# Altium schematic symbol library SCHLIB.SchLib: 2608 symbols (part 4 of 20)
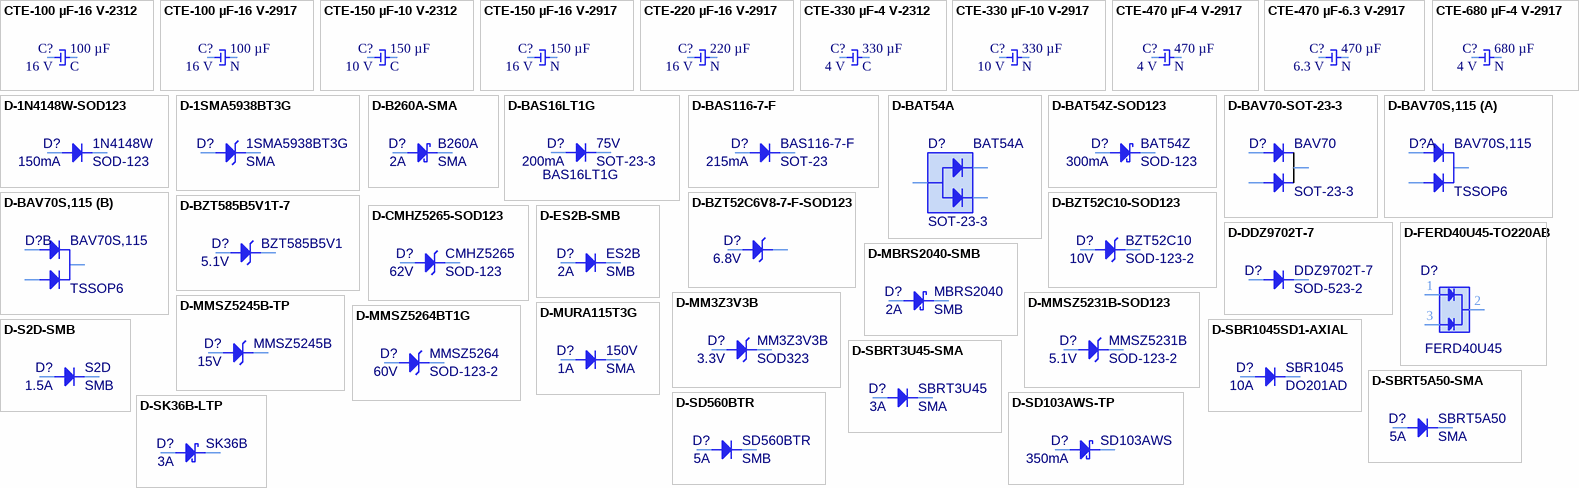
[diagram p86: symbols CTE-100 µF-16 V-2312 to D-SK36B-LTP]

## D-MMSZ5264BT1G
designator D?, comment MMSZ5264  Case/Package: SOD-123-2  Zener Voltage: 60V
DIODE ZENER 60V 500MW SOD123; Manufacturer: ON Semiconductor; Manufacturer Part Number: MMSZ5264BT1G; Material: Plastic; Tolerance: 5%; Impedance: 170R; Forward Voltage: 900mV; Max Reverse Leakage Current: 100nA; Test Current: 2.1mA; Element Configuration: Single; ESD Protection: Yes; Zener Current: 10mA; Supplier 1: Digi-Key; Supplier Part Number 1: MMSZ5264BT1GOSCT-ND; Stock: 12288; Pricing: 1=0.2, 10=0.162, 25=0.136, 100=0.0664, 250=0.0654, 500=0.0554, 1000=0.0385 (USD); RoHS: Yes; Number of Pins: 2; Contact Plating: Tin,Matte; Min Operating Temperature: -55°C; Max Operating Temperature: 150°C; Packaging: Tape and Reel; Max Power Dissipation: 500mW; Power Rating: 500mW; Package Quantity: 1; Voltage Tolerance: 5%; Power Dissipation: 500mW; Working Voltage: 60V; Peak Reverse Current: 100nA; Length: 2.84mm; Height: 1.25mm; Width: 1.8mm; Radiation Hardening: No; Lead Free: Lead Free; ComponentLink1URL: https://datasheet.ciiva.com/30478/0900766b81276af2-30478667.pdf?src-supplier=RSComponents; ComponentLink1Description: https://datasheet.ciiva.com/30478/0900766b81276af2-30478667.pdf?src-supplier=RSComponents; ComponentLink2URL: https://datasheet.ciiva.com/894/mmsz5221bt1-d-894960.pdf?src-supplier=Digi-Key; ComponentLink2Description: https://datasheet.ciiva.com/894/mmsz5221bt1-d-894960.pdf?src-supplier=Digi-Key; ComponentLink3URL: https://datasheet.ciiva.com/894/mmsz5221bt1-d-894961.pdf?src-supplier=Digi-Key; ComponentLink3Description: https://datasheet.ciiva.com/894/mmsz5221bt1-d-894961.pdf?src-supplier=Digi-Key; ComponentLink4URL: https://datasheet.ciiva.com/8348/mmsz5221bt1-d-8348069.pdf?src-supplier=Avnet; ComponentLink4Description: https://datasheet.ciiva.com/8348/mmsz5221bt1-d-8348069.pdf?src-supplier=Avnet; ComponentLink5URL: https://datasheet.ciiva.com/4733/mmsz5221bt1-d-4733559.pdf?src-supplier=Mouser; ComponentLink5Description: https://datasheet.ciiva.com/4733/mmsz5221bt1-d-4733559.pdf?src-supplier=Mouser; ComponentLink6URL: https://datasheet.ciiva.com/16375/mmsz5221bt1-d-16375896.pdf?src-supplier=Future+Electronics; ComponentLink6Description: https://datasheet.ciiva.com/16375/mmsz5221bt1-d-16375896.pdf?src-supplier=Future+Electronics; ComponentLink7URL: https://datasheet.ciiva.com/894/mmsz5221bt1-d-894959.pdf?src-supplier=Digi-Key; ComponentLink7Description: https://datasheet.ciiva.com/894/mmsz5221bt1-d-894959.pdf?src-supplier=Digi-Key; Voltage Rating (DC): 60V
footprint D-SOD-123-2 (SOD, 2-Leads, Body 2.69x1.6mm)
pins: A, C

## D-MURA115T3G
designator D?, comment Max Reverse Voltage (DC): 150V  Current Rating: 1A  Case/Package: SMA  (hidden comment: MURA115T3G)
DIODE GEN PURP 150V 2A SMA; Manufacturer: ON Semiconductor; Max Surge Current: 40A; Forward Voltage: 875mV; Peak Reverse Current: 2uA; Recovery Time: 35ns; Element Configuration: Single; Polarity: Standard; Washability: OK; Supplier 1: Digi-Key; Manufacturer Part Number: MURA115T3G; Stock 1: 18980; Pricing 1: 1=0.41000, 10=0.32800, 100=0.18850, 500=0.17458, 1000=0.11871 (USD); RoHS: Yes; Number of Pins: 2; Contact Plating: Tin,Matte; Min Operating Temperature: -65°C; Max Operating Temperature: 175°C; Package Quantity: 1; Forward Current: 2A; Packaging: Tape and Reel; Reverse Recovery Time: 35ns; Peak Non-Repetitive Surge Current: 40A; Max Repetitive Reverse Voltage (Vrrm): 150V; Max Forward Surge Current (Ifsm): 40A; Voltage Rating (DC): 150V; Output Current: 1A; Reverse Voltage: 150V; Length: 4.57mm; Height: 2.05mm; Width: 2.92mm; Radiation Hardening: No; REACH SVHC: No SVHC; Lead Free: Lead Free; Halogen Free: Halogen Free; ComponentLink1URL: https://datasheet.ciiva.com/923/mura115t3-d-923155.pdf?src-supplier=Digi-Key; ComponentLink1Description: https://datasheet.ciiva.com/923/mura115t3-d-923155.pdf?src-supplier=Digi-Key; ComponentLink2URL: https://datasheet.ciiva.com/923/mura115t3-d-923156.pdf?src-supplier=Digi-Key; ComponentLink2Description: https://datasheet.ciiva.com/923/mura115t3-d-923156.pdf?src-supplier=Digi-Key; ComponentLink3URL: https://datasheet.ciiva.com/25950/mura115t3-d-25950373.pdf?src-supplier=Avnet+Europe; ComponentLink3Description: https://datasheet.ciiva.com/25950/mura115t3-d-25950373.pdf?src-supplier=Avnet+Europe; ComponentLink4URL: https://datasheet.ciiva.com/8292/mura115t3-d-8292665.pdf?src-supplier=Avnet; ComponentLink4Description: https://datasheet.ciiva.com/8292/mura115t3-d-8292665.pdf?src-supplier=Avnet; ComponentLink5URL: https://datasheet.ciiva.com/923/mura115t3-d-923157.pdf?src-supplier=Digi-Key; ComponentLink5Description: https://datasheet.ciiva.com/923/mura115t3-d-923157.pdf?src-supplier=Digi-Key; Supplier Part Number 1: MURA115T3GOSCT-ND; Average Rectified Current: 2A
footprint D-SMA-DO214AC
pins: A, C

## D-S2D-SMB
designator D?, comment S2D  Average Rectified Current: 1.5A  Case/Package: SMB
DIODE GEN PURP 200V 1.5A SMB; Manufacturer: Vishay Semiconductors; Manufacturer Part Number: S2D-E3/5BT; Peak Reverse Current: 1uA; Max Surge Current: 50A; Recovery Time: 2000ns; Forward Voltage: 1.15V; Reverse Recovery Time: 2us; Element Configuration: Single; Washability: OK; Supplier 1: Digi-Key; Supplier Part Number 1: S2D-E3/5BTGICT-ND; Stock 1: 13927; Pricing 1: 1=0.44, 10=0.331, 100=0.1872, 500=0.12396, 1000=0.09503 (USD); Mount: Surface Mount; Number of Pins: 2; Min Operating Temperature: -55°C; Max Operating Temperature: 150°C; Packaging: Tape and Reel; Forward Current: 1.5A; Package Quantity: 1; Max Repetitive Reverse Voltage (Vrrm): 200V; Peak Non-Repetitive Surge Current: 50A; Max Reverse Voltage (DC): 200V; Reverse Voltage: 200V; Radiation Hardening: No; Lead Free: Lead Free
footprint D-SMB-DO214AA
pins: A, C

## D-SBR1045SD1-AXIAL
designator D?, comment SBR1045  Average Rectified Current: 10A  Package / Case: DO201AD
DIODE SBR 45V 10A DO201AD; Manufacturer: Diodes; Manufacturer Part Number: SBR1045SD1-T; Peak Reverse Current: 450uA; Forward Voltage: 550mV; Peak Non-Repetitive Surge Current: 180A; Element Configuration: Single; Washability: OK; Supplier 1: Digi-Key; Supplier Part Number 1: SBR1045SD1-TDICT-ND; Stock 1: 4145; Pricing 1: 1=0.74, 10=0.654, 100=0.5016, 500=0.39656 (USD); Mount: Through Hole; Number of Pins: 2; Min Operating Temperature: -65°C; Max Operating Temperature: 150°C; Forward Current: 10A; Packaging: Tape and Reel; Package Quantity: 1200; Reverse Voltage (DC): 45V; Radiation Hardening: No; REACH SVHC: No SVHC; Lead Free: Lead Free; ComponentLink1URL: https://www.diodes.com/assets/Datasheets/SBR1045SD1.pdf; ComponentLink1Description: https://www.diodes.com/assets/Datasheets/SBR1045SD1.pdf; ComponentLink2URL: http://www.mouser.com/ds/2/115/SBR1045SD1-464814.pdf; ComponentLink2Description: http://www.mouser.com/ds/2/115/SBR1045SD1-464814.pdf; Max Repetitive Reverse Voltage (Vrrm): 45V; Weight: 0.038801oz; Max Reverse Voltage (DC): 45V
footprint D-DO-201-H
pins: A, C

## D-SBRT3U45-SMA
designator D?, comment SBRT3U45  Average Rectified Current: 3A  Case/Package: SMA
DIODE SBR 45V 3A SMA; Manufacturer: Diodes; Manufacturer Part Number: SBRT3U45SA-13; Element Configuration: Single; Forward Voltage: 420mV; Max Forward Surge Current (Ifsm): 50A; Peak Reverse Current: 40mA; Washability: OK; Supplier 1: Digi-Key; Supplier Part Number 1: SBRT3U45SA-13DIDKR-ND; Stock 1: 4929; Pricing 1: 1=0.43, 10=0.346, 100=0.2357, 500=0.17674, 1000=0.13256 (USD); Mount: Surface Mount; Weight: 0.002258oz; Min Operating Temperature: -55°C; Max Operating Temperature: 150°C; Packaging: Tape and Reel; Max Repetitive Reverse Voltage (Vrrm): 45V; Package Quantity: 5000; Max Reverse Voltage (DC): 45V; Lead Free: Lead Free
footprint D-SMA-DO214AC
pins: A, C

## D-SBRT5A50-SMA
designator D?, comment SBRT5A50  Average Rectified Current: 5A  Case/Package: SMA
DIODE SBR 50V 5A SMA; Manufacturer: Diodes; Manufacturer Part Number: SBRT5A50SA-13; Element Configuration: Single; Forward Voltage: 460mV; Max Forward Surge Current (Ifsm): 70A; Peak Reverse Current: 45mA; Washability: OK; Supplier 1: Digi-Key; Supplier Part Number 1: SBRT5A50SA-13DIDKR-ND; Stock 1: 46931; Pricing 1: 1=0.53, 10=0.426, 100=0.29, 500=0.21754, 1000=0.16315 (USD); Mount: Surface Mount; Weight: 0.002258oz; Min Operating Temperature: -55°C; Max Operating Temperature: 150°C; Packaging: Tape and Reel; Max Repetitive Reverse Voltage (Vrrm): 50V; Package Quantity: 5000; Max Reverse Voltage (DC): 50V; Lead Free: Lead Free
footprint D-SMA-DO214AC
pins: A, C

## D-SD103AWS-TP
designator D?, comment SD103AWS  Current Rating: 350mA
DIODE SCHOTTKY 40V 350MA SOD323; Manufacturer: MCC; Manufacturer Part Number: SD103AWS-TP; Forward Voltage: 600mV; Recovery Time: 10ns; Peak Non-Repetitive Surge Current: 1.5A; Peak Reverse Current: 5uA; Element Configuration: Single; Polarity: Standard; Capacitance: 50pF; Power Dissipation: 400mW; Washability: OK; Supplier 1: Digi-Key; Stock 1: 63676; Pricing 1: 1=0.34000, 10=0.27700, 100=0.14680, 500=0.09656, 1000=0.06566 (USD); RoHS: Yes; Mount: Surface Mount; Number of Pins: 2; Min Operating Temperature: -55°C; Max Operating Temperature: 125°C; Packaging: Tape and Reel; Package Quantity: 1; Average Rectified Current: 350mA; Reverse Recovery Time: 10ns; Max Repetitive Reverse Voltage (Vrrm): 40V; Forward Current: 350mA; Max Forward Surge Current (Ifsm): 1.5A; Voltage Rating (DC): 40V; Output Current: 350mA; Max Reverse Voltage (DC): 40V; Max Surge Current: 1.5A; Max Reverse Leakage Current: 5uA; Radiation Hardening: No; Lead Free: Lead Free; REACH SVHC: Unknown; ComponentLink1URL: https://datasheet.ciiva.com/15200/getdatasheetpartid-331926-15200560.pdf?src-supplier=Verical; ComponentLink1Description: https://datasheet.ciiva.com/15200/getdatasheetpartid-331926-15200560.pdf?src-supplier=Verical; ComponentLink2URL: https://datasheet.ciiva.com/16975/sd103aws-sd103cwssod-323-16975366.pdf?src-supplier=Future+Electronics; ComponentLink2Description: https://datasheet.ciiva.com/16975/sd103aws-sd103cwssod-323-16975366.pdf?src-supplier=Future+Electronics; ComponentLink3URL: https://datasheet.ciiva.com/912/sd103aws-sd103cwssod-323-912220.pdf?src-supplier=Digi-Key; ComponentLink3Description: https://datasheet.ciiva.com/912/sd103aws-sd103cwssod-323-912220.pdf?src-supplier=Digi-Key; ComponentLink4URL: https://datasheet.ciiva.com/912/sd103aws-sd103cwssod-323-912221.pdf?src-supplier=Digi-Key; ComponentLink4Description: https://datasheet.ciiva.com/912/sd103aws-sd103cwssod-323-912221.pdf?src-supplier=Digi-Key; ComponentLink5URL: https://datasheet.ciiva.com/7963/1684867-7963309.pdf?src-supplier=Element14; ComponentLink5Description: https://datasheet.ciiva.com/7963/1684867-7963309.pdf?src-supplier=Element14; ComponentLink6URL: https://datasheet.ciiva.com/912/sd103aws-sd103cwssod-323-912222.pdf?src-supplier=Digi-Key; ComponentLink6Description: https://datasheet.ciiva.com/912/sd103aws-sd103cwssod-323-912222.pdf?src-supplier=Digi-Key; Supplier Part Number 1: SD103AWSTPMSCT-ND
footprint D-SOD323
pins: A, C

## D-SD560BTR
designator D?, comment SD560BTR  Average Rectified Current: 5A  Case/Package: SMB
DIODE GEN 600V 5A; Manufacturer: SMC; Supplier 1: Digi-Key; Manufacturer Part Number: SD560BTR; Stock 1: 85170; Pricing 1: 1=0,40000, 10=0,26300, 100=0,14640, 500=0,09760, 1000=0,07133 (USD); RoHS: No; Mount: Surface Mount; Packaging: Tape and Reel; Max Reverse Voltage (DC): 600V; ComponentLink1URL: http://www.smc-diodes.com/propdf/SD560B%20N1412%20REV.D.pdf?src-supplier=Digi-Key; ComponentLink1Description: http://www.smc-diodes.com/propdf/SD560B%20N1412%20REV.D.pdf?src-supplier=Digi-Key; Supplier 2: Digi-Key; Manufacturer Part Number 2: SD560BTR; Stock 2: 84000; Pricing 2: 3000=0,06945, 6000=0,06570, 9000=0,06006, 30000=0,05631, 75000=0,04993 (USD)
footprint D-SMB-DO214AA
pins: A, C

## D-SK36B-LTP
designator D?, comment SK36B  Forward Current: 3A
DIODE SCHOTTKY 60V 3A DO214AA; Manufacturer: MCC; Manufacturer Part Number: SK36B-LTP; Forward Voltage: 750mV; Max Forward Surge Current (Ifsm): 100A; Peak Reverse Current: 20mA; Washability: OK; Supplier 1: Digi-Key; RoHS: Yes; Stock 1: 54925; Pricing 1: 1 = 0,60000, 10 = 0,42000, 100 = 0,27600, 500 = 0,16310, 1000 = 0,12545 (USD); Mount: Surface Mount; Number of Pins: 2; Min Operating Temperature: -55°C; Max Operating Temperature: 150°C; Package Quantity: 1; Packaging: Tape and Reel; Average Rectified Current: 3A; Max Repetitive Reverse Voltage (Vrrm): 60V; Max Reverse Voltage (DC): 60V; Lead Free: Lead Free; ComponentLink1URL: http://www.mccsemi.com/up_pdf/SK32B-L~SK310B-L%28DO-214AA%29.pdf?src-supplier=Digi-Key; ComponentLink1Description: http://www.mccsemi.com/up_pdf/SK32B-L~SK310B-L%28DO-214AA%29.pdf?src-supplier=Digi-Key; Supplier Part Number 1: SK36B-LTPMSCT-ND
footprint D-SMB-DO214AA
pins: A, C

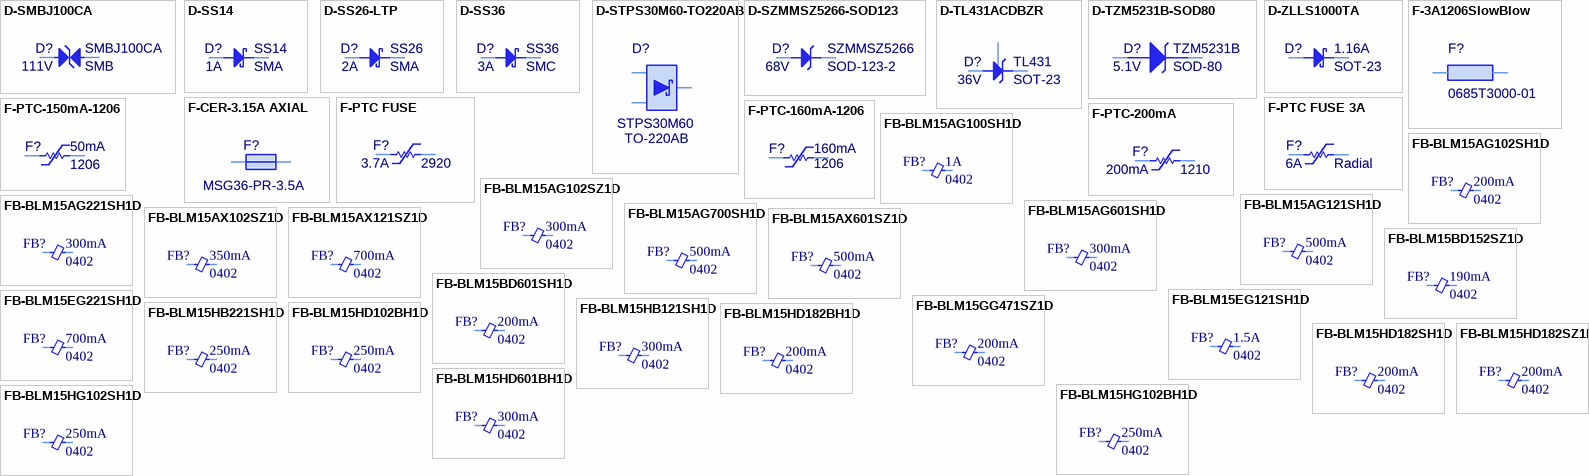
[diagram p12: symbols D-SMBJ100CA to FB-BLM15HG102SH1D]

## D-SMBJ100CA
designator D?, comment SMBJ100CA  Reverse Breakdown Voltage: 111V  Case/Package: SMB
TVS DIODE 100V 162V SMB; Manufacturer: Bourns; Breakdown Voltage: 128V; Number of Channels: 1; Polarity: Bidirectional; Peak Pulse Power: 600W; Power Line Protection: No; Peak Pulse Current: 3.7A; Test Current: 1mA; Operating Supply Voltage: 5V; Max Surge Current: 100A; Leakage Current: 5uA; Supplier 1: Digi-Key; Manufacturer Part Number: SMBJ100CA; Stock 1: 9291; Pricing 1: 1=0,48000, 10=0,32500, 100=0,19180, 500=0,12980, 1000=0,10325 (USD); RoHS: Yes; Mount: Surface Mount; Number of Pins: 2; Min Operating Temperature: -55°C; Termination: SMD/SMT; Number of Bidirectional Channels: 1; Reverse Standoff Voltage: 100V; Min Breakdown Voltage: 111V; Clamping Voltage: 162V; Number of Elements: 1; Packaging: Tape and Reel; Package Quantity: 1; Resistor Type: Zener; ComponentLink1URL: https://datasheet.ciiva.com/4509/smbj-51809-4509942.pdf?src-supplier=Mouser; ComponentLink1Description: https://datasheet.ciiva.com/4509/smbj-51809-4509942.pdf?src-supplier=Mouser; ComponentLink2URL: https://datasheet.ciiva.com/334/smbj-334749.pdf?src-supplier=Digi-Key; ComponentLink2Description: https://datasheet.ciiva.com/334/smbj-334749.pdf?src-supplier=Digi-Key; ComponentLink3URL: https://datasheet.ciiva.com/334/smbj-334750.pdf?src-supplier=Digi-Key; ComponentLink3Description: https://datasheet.ciiva.com/334/smbj-334750.pdf?src-supplier=Digi-Key; ComponentLink4URL: https://datasheet.ciiva.com/334/smbj-334748.pdf?src-supplier=Digi-Key; ComponentLink4Description: https://datasheet.ciiva.com/334/smbj-334748.pdf?src-supplier=Digi-Key; Max Operating Temperature: 150°C; Supplier Part Number 1: SMBJ100CABCT-ND
footprint D-SMB-DO214AA
pins: A, C

## D-SS14
designator D?, comment SS14  Current: 1A  Case/Package: SMA
DIODE SCHOTTKY 40V 1A SMA; Manufacturer: ON Semiconductor / Fairchild; Peak Reverse Current: 200uA; Element Configuration: Single; Forward Voltage: 500mV; Peak Non-Repetitive Surge Current: 40A; Polarity: Standard; Number of Elements: 1; Max Power Dissipation: 1.1W; Washability: OK; Supplier 1: Digi-Key; Manufacturer Part Number: SS14; Stock 1: 180040; Pricing 1: 1=0.45, 10=0.342, 100=0.2129, 500=0.14564, 1000=0.11204 (USD); Mount: Surface Mount; Number of Pins: 2; Weight: 0.003739oz; Number of Terminals: 2; Min Operating Temperature: -65°C; Max Operating Temperature: 125°C; Packaging: Tape and Reel; Current Rating: 1A; Package Quantity: 7500; Forward Current: 1A; Max Repetitive Reverse Voltage (Vrrm): 40V; Voltage Rating (DC): 40V; Max Forward Surge Current (Ifsm): 40A; Termination: SMD/SMT; Output Current: 1A; Average Rectified Current: 1A; Max Reverse Voltage (DC): 40V; Voltage: 40V; Power Dissipation: 1.1W; Length: 4.75mm; Height: 2.2mm; Width: 2.95mm; Radiation Hardening: No; REACH SVHC: No SVHC; Lead Free: Lead Free; ComponentLink1URL: http://www.mouser.com/ds/2/149/SS14-197224.pdf; ComponentLink1Description: http://www.mouser.com/ds/2/149/SS14-197224.pdf; ComponentLink2URL: http://www.jameco.com/Jameco/Products/ProdDS/1089027.pdf; ComponentLink2Description: http://www.jameco.com/Jameco/Products/ProdDS/1089027.pdf; ComponentLink3URL: https://www.fairchildsemi.com/datasheets/SS/SS19.pdf; ComponentLink3Description: https://www.fairchildsemi.com/datasheets/SS/SS19.pdf; ComponentLink4URL: https://www.fairchildsemi.com/package-drawings/DO/DO214AC.pdf; ComponentLink4Description: https://www.fairchildsemi.com/package-drawings/DO/DO214AC.pdf; ComponentLink5URL: http://www.fairchildsemi.com/ds/SS/SS19.pdf; ComponentLink5Description: http://www.fairchildsemi.com/ds/SS/SS19.pdf; ComponentLink6URL: http://www.farnell.com/datasheets/1880990.pdf; ComponentLink6Description: http://www.farnell.com/datasheets/1880990.pdf; ComponentLink7URL: http://www.fairchildsemi.com/ds/SS/SS14.pdf; ComponentLink7Description: http://www.fairchildsemi.com/ds/SS/SS14.pdf; Supplier Part Number 1: SS14DKR-ND
footprint D-SMA-DO214AC
pins: A, C

## D-SS26-LTP
designator D?, comment SS26  Case/Package: SMA  Average Rectified Current: 2A
DIODE SCHOTTKY 2A 60V SMA; Manufacturer: MCC; Manufacturer Part Number: SS26-LTP; Supplier 1: Digi-Key; Supplier Part Number 1: SS26-LTPMSCT-ND; Stock: 7359; Pricing: 1=0.47, 10=0.354, 25=0.3192, 100=0.1682, 250=0.1665, 500=0.1491, 1000=0.116, 2500=0.1061 (USD); RoHS: Yes; Mount: Surface Mount; Number of Pins: 2; Max Reverse Voltage (DC): 60V; Packaging: Tape and Reel; ComponentLink1URL: http://components.arrow.com/part/dataview/51823664S300513N2022?src-supplier=Arrow; ComponentLink1Description: http://components.arrow.com/part/dataview/51823664S300513N2022?src-supplier=Arrow; ComponentLink2URL: http://www.mccsemi.com/up_pdf/SS22-L-SS220-L(DO-214AC).pdf?src-supplier=Digi-Key; ComponentLink2Description: http://www.mccsemi.com/up_pdf/SS22-L-SS220-L(DO-214AC).pdf?src-supplier=Digi-Key
footprint D-SMA-DO214AC
pins: A, C

## D-SS36
designator D?, comment SS36  Case/Package: SMC  Forward Current: 3A
DIODE SCHOTTKY 60V 3A SMC; Manufacturer: ON Semiconductor / Fairchild; Forward Voltage: 750mV; Polarity: Standard; Max Surge Current: 100A; Max Reverse Leakage Current: 500uA; Element Configuration: Single; Power Dissipation: 2.27W; Washability: OK; Supplier 1: Digi-Key; Stock 1: 17122; Pricing 1: 1=0.61, 10=0.536, 100=0.4113, 500=0.3251, 1000=0.26008 (USD); Mount: Surface Mount; Number of Pins: 2; Min Operating Temperature: -55°C; Max Operating Temperature: 150°C; Packaging: Tape and Reel; Voltage Rating (DC): 60V; Current Rating: 3A; Output Current: 3A; Package Quantity: 3000; Peak Reverse Current: 500uA; Average Rectified Current: 3A; Max Repetitive Reverse Voltage (Vrrm): 60V; Max Forward Surge Current (Ifsm): 100A; Peak Non-Repetitive Surge Current: 100A; Current: 3A; Voltage: 60V; Max Reverse Voltage (DC): 60V; Radiation Hardening: No; REACH SVHC: No SVHC; Lead Free: Lead Free; ComponentLink1URL: http://www.fairchildsemi.com/datasheets/SS/SS34.pdf?src-supplier=Digi-Key; ComponentLink1Description: http://www.fairchildsemi.com/datasheets/SS/SS34.pdf?src-supplier=Digi-Key; ComponentLink2URL: https://www.fairchildsemi.com/package-drawings/DO/DO214AB.pdf?src-supplier=Digi-Key; ComponentLink2Description: https://www.fairchildsemi.com/package-drawings/DO/DO214AB.pdf?src-supplier=Digi-Key; ComponentLink3URL: http://www.mouser.com/ds/2/149/SS36-197193.pdf?src-supplier=Mouser; ComponentLink3Description: http://www.mouser.com/ds/2/149/SS36-197193.pdf?src-supplier=Mouser; ComponentLink4URL: https://www.fairchildsemi.com/datasheets/SS/SS39.pdf?src-supplier=Avnet+Europe; ComponentLink4Description: https://www.fairchildsemi.com/datasheets/SS/SS39.pdf?src-supplier=Avnet+Europe; ComponentLink5URL: http://www.fairchildsemi.com/ds/SS/SS36.pdf?src-supplier=Future+Electronics; ComponentLink5Description: http://www.fairchildsemi.com/ds/SS/SS36.pdf?src-supplier=Future+Electronics; Manufacturer Part Number: SS36; Supplier Part Number 1: SS36FSDKR-ND
pins: A, C

## D-STPS30M60-TO220AB
designator D?, comment STPS30M60  Case/Package: TO-220AB
DIODE SCHOTTKY 60V 30A TO220AB; Manufacturer: STMicroelectronics; Manufacturer Part Number: STPS30M60ST; Max Surge Current: 600A; Element Configuration: Single; Peak Reverse Current: 165uA; Forward Voltage: 590mV; Washability: OK; Supplier 1: Digi-Key; Supplier Part Number 1: 497-12324-ND; Stock 1: 1496; Pricing 1: 1=2.94, 50=2.4938, 100=2.1247, 500=1.74562, 1000=1.44638 (USD); Mount: Through Hole; Number of Pins: 3; Min Operating Temperature: -65°C; Max Operating Temperature: 150°C; Packaging: Rail/Tube; Forward Current: 30A; Package Quantity: 50; Max Reverse Leakage Current: 165uA; Average Rectified Current: 30A; Max Repetitive Reverse Voltage (Vrrm): 60V; Peak Non-Repetitive Surge Current: 600A; Max Forward Surge Current (Ifsm): 600A; Max Reverse Voltage (DC): 60V; Length: 10.4mm; Height: 15.75mm; Width: 4.6mm; Radiation Hardening: No; REACH SVHC: No SVHC; Lead Free: Lead Free; ComponentLink1URL: http://www.st.com/web/en/resource/technical/document/datasheet/DM00034932.pdf; ComponentLink1Description: http://www.st.com/web/en/resource/technical/document/datasheet/DM00034932.pdf; ComponentLink2URL: http://www.st.com/content/ccc/resource/technical/document/datasheet/5e/39/b2/48/ff/81/45/23/DM00034932.pdf/files/DM00034932.pdf/jcr:content/translations/en.DM00034932.pdf; ComponentLink2Description: http://www.st.com/content/ccc/resource/technical/document/datasheet/5e/39/b2/48/ff/81/45/23/DM00034932.pdf/files/DM00034932.pdf/jcr:content/translations/en.DM00034932.pdf
footprint TO-220AB
pins: 1, 2, 3

## D-SZMMSZ5266-SOD123
designator D?, comment SZMMSZ5266  Zener Voltage: 68V  Case/Package: SOD-123-2
DIODE ZENER 68V 500MW SOD123; Manufacturer: ON Semiconductor; Manufacturer Part Number: SZMMSZ5266BT1G; Tolerance: 5%; Impedance: 230R; Max Reverse Leakage Current: 100nA; Element Configuration: Single; Washability: OK; Supplier 1: Digi-Key; Supplier Part Number 1: SZMMSZ5266BT1GOSDKR-ND; Stock 1: 185; Pricing 1: 1=0.38, 10=0.286, 100=0.1617, 500=0.10706, 1000=0.08209 (USD); Number of Pins: 2; Min Operating Temperature: -55°C; Max Operating Temperature: 150°C; Packaging: Tape and Reel; Max Power Dissipation: 500mW; Package Quantity: 3000; Voltage Tolerance: 5%; Radiation Hardening: No; Lead Free: Lead Free; ComponentLink1URL: http://www.mouser.com/ds/2/308/MMSZ5221BT1-D-85810.pdf; ComponentLink1Description: http://www.mouser.com/ds/2/308/MMSZ5221BT1-D-85810.pdf; ComponentLink2URL: http://www.onsemi.com/pub/Collateral/MMSZ5221BT1-D.PDF; ComponentLink2Description: http://www.onsemi.com/pub/Collateral/MMSZ5221BT1-D.PDF
footprint D-SOD123
pins: A, C

## D-TL431ACDBZR
designator D?, comment Manufacturer Part Number 1: TL431  Max Output Voltage: 36V  Case/Package: SOT-23  (hidden comment: IC VREF SHUNT ADJ SOT23-3)
Shunt Voltage Reference IC 36V ±1% 100mA SOT-23-3; Manufacturer 1: Texas Instruments; Max Input Voltage: 37V; Number of Channels: 1; Min Input Voltage: 2.495V; Temperature Coefficient: 34ppm/°C; Cathode Current: 600uA; Min Output Voltage: 2.5V; Reference Type: Shunt,Adjustable; Washability: OK; Supplier 1: Digi-Key; Stock 1: 69254; Pricing 1: 1=0,37000, 10=0,30000, 100=0,20440, 500=0,15326, 1000=0,11495 (USD); RoHS: Yes; Number of Pins: 3; Min Operating Temperature: -40°C; Max Operating Temperature: 125°C; Packaging: Tape and Reel; Output Voltage: 36V; Package Quantity: 1; Tolerance: 1%; Max Output Current: 100mA; Output Current: 100mA; Reference Voltage: 36V; Termination: SMD/SMT; Length: 2.92mm; Height: 1mm; Width: 1.3mm; Radiation Hardening: No; REACH SVHC: No SVHC; Lead Free: Lead Free; ComponentLink1URL: https://datasheet.ciiva.com/15149/getdatasheetpartid-184457-15149018.pdf?src-supplier=Verical; ComponentLink1Description: https://datasheet.ciiva.com/15149/getdatasheetpartid-184457-15149018.pdf?src-supplier=Verical; ComponentLink2URL: https://datasheet.ciiva.com/3235/tl432b-3235591.pdf?src-supplier=Avnet; ComponentLink2Description: https://datasheet.ciiva.com/3235/tl432b-3235591.pdf?src-supplier=Avnet; ComponentLink3URL: https://datasheet.ciiva.com/2006/tl431a-2006220.pdf?src-supplier=Digi-Key; ComponentLink3Description: https://datasheet.ciiva.com/2006/tl431a-2006220.pdf?src-supplier=Digi-Key; ComponentLink4URL: https://datasheet.ciiva.com/2006/tl431a-2006221.pdf?src-supplier=Digi-Key; ComponentLink4Description: https://datasheet.ciiva.com/2006/tl431a-2006221.pdf?src-supplier=Digi-Key; ComponentLink5URL: https://datasheet.ciiva.com/2006/tl431a-2006222.pdf?src-supplier=Digi-Key; ComponentLink5Description: https://datasheet.ciiva.com/2006/tl431a-2006222.pdf?src-supplier=Digi-Key; ComponentLink6URL: https://datasheet.ciiva.com/26264/tl432b-26264222.pdf?src-supplier=Avnet+Europe; ComponentLink6Description: https://datasheet.ciiva.com/26264/tl432b-26264222.pdf?src-supplier=Avnet+Europe; Supplier Part Number 1: 296-17328-1-ND
footprint D-SOT23-3
pins: 1, 2, 3

## D-TZM5231B-SOD80
designator D?, comment TZM5231B  Zener Voltage: 5.1V  Package / Case: SOD-80
DIODE ZENER 5.1V 500MW SOD80; Manufacturer: Vishay Semiconductors; Manufacturer Part Number: TZM5231B-GS08; Colour: Red; Lens Style: Circular,Colorless,Diffused; Viewing Angle: 18°; Forward Voltage: 1.1V; Tolerance: 5%; Zener Current: 200mA; Max Reverse Leakage Current: 5uA; Impedance: 17R; Test Current: 20mA; Dominant Wavelength: 630nm; Element Configuration: Single; Number of LEDs: 1; Washability: OK; Supplier 1: Digi-Key; Supplier Part Number 1: TZM5231B-GS08DKR-ND; Stock 1: 56883; Pricing 1: 1=0.22, 10=0.199, 25=0.1892, 100=0.1083, 250=0.08024, 500=0.06662, 1000=0.04542 (USD); Mount: Surface Mount; Number of Pins: 2; Min Operating Temperature: -65°C; Max Operating Temperature: 175°C; Packaging: Tape and Reel; Max Power Dissipation: 500mW; Package Quantity: 1; Voltage Tolerance: 5%; Power Dissipation: 500mW; Working Voltage: 5.1V; Peak Reverse Current: 5uA; Diameter: 1.6mm; Length: 0.145inch; Height: 1.5mm; Width: 1.5mm; Radiation Hardening: No; REACH SVHC: Unknown; Lead Free: Lead Free; ComponentLink1URL: http://www.farnell.com/datasheets/1347039.pdf; ComponentLink1Description: http://www.farnell.com/datasheets/1347039.pdf; ComponentLink2URL: http://www.jameco.com/Jameco/Products/ProdDS/891350.pdf; ComponentLink2Description: http://www.jameco.com/Jameco/Products/ProdDS/891350.pdf; ComponentLink3URL: https://www.verical.com/server-webapp/html/getDatasheet?partID=71614; ComponentLink3Description: https://www.verical.com/server-webapp/html/getDatasheet?partID=71614; ComponentLink4URL: http://www.farnell.com/datasheets/1862259.pdf; ComponentLink4Description: http://www.farnell.com/datasheets/1862259.pdf; ComponentLink5URL: http://www.vishay.com/docs/85609/tzm5221.pdf; ComponentLink5Description: http://www.vishay.com/docs/85609/tzm5221.pdf; Supplier 2: Digi-Key; Supplier Part Number 2: 1727-4247-6-ND; Stock 2: 40815; Pricing 2: 1=0.2, 10=0.185, 100=0.1005, 500=0.06186, 1000=0.04218 (USD)
footprint D-SOD80
pins: A, C

## D-ZLLS1000TA
designator D?, comment Forward Current: 1.16A  Case/Package: SOT-23  (hidden comment: ZLLS1000TA)
DIODE SCHOTTKY 40V 1.16A SOT23-3; Manufacturer: Diodes Zetex; Peak Non-Repetitive Surge Current: 22A; Element Configuration: Single; Peak Reverse Current: 20uA; Forward Voltage: 660mV; Reverse Recovery Time: 5ns; Power Dissipation: 625mW; Polarity: Standard; Current Rating: 1.6A; Capacitance: 26pF; Washability: OK; Supplier 1: Future Electronics; Manufacturer Part Number: ZLLS1000TA; Stock 1: 600; Pricing 1: 1=0,58000, 250=0,33500, 500=0,31500, 750=0,30500, 1500=0,28500 (USD); RoHS: Yes; Mount: Surface Mount; Number of Pins: 3; Weight: 0.000282oz; Contact Plating: Tin,Matte; Min Operating Temperature: -55°C; Max Operating Temperature: 150°C; Max Repetitive Reverse Voltage (Vrrm): 40V; Package Quantity: 3000; Packaging: Tape and Reel; Average Rectified Current: 1.16A; Max Forward Surge Current (Ifsm): 22A; Max Reverse Voltage (DC): 40V; Termination: SMD/SMT; Voltage Rating (DC): 40V; Output Current: 1.16A; Max Power Dissipation: 625mW; Length: 3.05mm; Height: 1mm; Width: 1.4mm; Radiation Hardening: No; Lead Free: Lead Free; REACH SVHC: No SVHC; ComponentLink1URL: https://datasheet.ciiva.com/914/zlls1000-914640.pdf?src-supplier=Digi-Key; ComponentLink1Description: https://datasheet.ciiva.com/914/zlls1000-914640.pdf?src-supplier=Digi-Key; ComponentLink2URL: https://datasheet.ciiva.com/5794/1643157-5794548.pdf?src-supplier=Farnell; ComponentLink2Description: https://datasheet.ciiva.com/5794/1643157-5794548.pdf?src-supplier=Farnell; ComponentLink3URL: https://datasheet.ciiva.com/914/zlls1000-914641.pdf?src-supplier=Digi-Key; ComponentLink3Description: https://datasheet.ciiva.com/914/zlls1000-914641.pdf?src-supplier=Digi-Key; ComponentLink4URL: https://datasheet.ciiva.com/914/zlls1000-914642.pdf?src-supplier=Digi-Key; ComponentLink4Description: https://datasheet.ciiva.com/914/zlls1000-914642.pdf?src-supplier=Digi-Key; ComponentLink5URL: https://datasheet.ciiva.com/5794/1643157-5794549.pdf?src-supplier=Farnell; ComponentLink5Description: https://datasheet.ciiva.com/5794/1643157-5794549.pdf?src-supplier=Farnell; ComponentLink6URL: https://datasheet.ciiva.com/4715/zlls1000-4715592.pdf?src-supplier=Mouser; ComponentLink6Description: https://datasheet.ciiva.com/4715/zlls1000-4715592.pdf?src-supplier=Mouser; ComponentLink7URL: https://datasheet.ciiva.com/7964/1643157-7964364.pdf?src-supplier=Element14; ComponentLink7Description: https://datasheet.ciiva.com/7964/1643157-7964364.pdf?src-supplier=Element14; Supplier Part Number 1: ZLLS1000TA-CUTT
footprint SOT23-3
pins: 1, 3

## F-3A1206SlowBlow
designator F?, comment 0685T3000-01
FUSE 3.0A 63VAC/DC SLOW 1206; Manufacturer: Bel; Fuse Type: Board Mount (Cartridge Style Excluded); Current Rating: 3A; Voltage Rating (AC): 63V; DC Cold Resistance: 54mR; Approvals: CE,cURus; Supplier 1: Arrow; Manufacturer Part Number: 0685T3000-01; Stock 1: 25000; Pricing 1: 5000=0,12060, 10000=0,11940, 25000=0,11820, 50000=0,11700, 5000=0,24000, 10000=0,15880, 25000=0,08080, 50000=0,07110, 100000=0,06720 (USD); RoHS: No; Mount: Surface Mount; Case/Package: 1206; Case Code (Imperial): 1206; Case Code (Metric): 3216; Min Operating Temperature: -55°C; Max Operating Temperature: 125°C; Packaging: Tape and Reel; Voltage Rating (DC): 63V; ComponentLink1URL: https://belfuse.com/resources/datasheets/circuitprotection/ds-cp-c1t-series.pdf?src-supplier=Digi-Key; ComponentLink1Description: https://belfuse.com/resources/datasheets/circuitprotection/ds-cp-c1t-series.pdf?src-supplier=Digi-Key; Supplier Part Number 1: 0685T3000-01
footprint L-1206
pins: 1, 2

## F-CER-3.15A AXIAL
designator F?, comment MSG36-PR-3.5A
FUSE CERAMIC 3.15A 250VAC AXIAL; Manufacturer: Schurter; Manufacturer Part Number: 8020.0519.PT; Voltage Rating (AC): 250V; Fuse Type: Cartridge, Ceramic; Approvals: VDE,cURus,CQC,cULus; Washability: OK; Supplier 1: Digi-Key; Stock 1: 3788; Pricing 1: 1=0,48000, 50=0,40000, 100=0,30500, 500=0,23400, 1000=0,20500 (USD); RoHS: Yes; Mount: Through Hole; Case/Package: Axial; Number of Pins: 2; Weight: 0.02187oz; Body Material: Ceramic; Min Operating Temperature: -20°C; Max Operating Temperature: 70°C; Current Rating: 3.15A; Package Quantity: 1000; Packaging: Bulk; Voltage Rating: 250V; Max Voltage Rating (AC): 250V; Termination: Axial; Composition: Ceramic; Fuse Current: 3.15A; Diameter: 3.6mm; Length: 0.433inch; Radiation Hardening: No; REACH SVHC: No SVHC; ComponentLink1URL: https://datasheet.ciiva.com/310/typ-spt-3-6x10-310229.pdf?src-supplier=Digi-Key; ComponentLink1Description: https://datasheet.ciiva.com/310/typ-spt-3-6x10-310229.pdf?src-supplier=Digi-Key; ComponentLink2URL: https://datasheet.ciiva.com/8071/1842600-8071670.pdf?src-supplier=Element14; ComponentLink2Description: https://datasheet.ciiva.com/8071/1842600-8071670.pdf?src-supplier=Element14; ComponentLink3URL: https://datasheet.ciiva.com/8265/typ-spt-3-6x10-8265753.pdf?src-supplier=Avnet; ComponentLink3Description: https://datasheet.ciiva.com/8265/typ-spt-3-6x10-8265753.pdf?src-supplier=Avnet
footprint F-AXIAL 4x11MM
pins: 1, 2

## F-PTC FUSE
designator F?  Trip Current: 3.7A  Case Code (Imperial): 2920
PTC RESET FUSE 33V 1.85A 2920; Manufacturer Part Number: 0ZCF0185FF2C; Manufacturer: Bel; Max Current Rating: 40A; Time to Trip: 2.5s; Resistance: 150mR; Max Power Dissipation: 1.5W; Approvals: cULus,TUV; Color: White; Number of Positions: 2; Connector Type: Male Pin; Pitch: 0.079inch; Washability: OK; Supplier 1: Digi-Key; Stock 1: 153770; Pricing 1: 1=0.29, 5=0.286, 10=0.273, 50=0.2436, 100=0.2268, 250=0.2016, 500=0.168, 1000=0.1596 (USD); Case Code (Metric): 7351; Package Quantity: 1; Packaging: Tape and Reel; Hold Current: 1.85A; Lead Free: Lead Free; ComponentLink1URL: https://belfuse.com/resources/CircuitProtection/datasheets/0ZCF%20Nov2016.pdf?src-supplier=Digi-Key; ComponentLink1Description: https://belfuse.com/resources/CircuitProtection/datasheets/0ZCF%20Nov2016.pdf?src-supplier=Digi-Key; Supplier Part Number 1: 507-1747-6-ND; Supplier 2: Digi-Key; Stock 2: 41097; Pricing 2: 1=0.81, 5=0.786, 10=0.762, 50=0.6414, 100=0.5324, 250=0.484, 500=0.4114 (USD); Case/Package: 2920; Terminal Material: Copper; Number of Terminals: 2; Min Operating Temperature: -40°C; Max Operating Temperature: 85°C; Voltage Rating: 33V; Current Rating: 40A; Operating Supply Voltage: 33V; Termination: SMD/SMT; Voltage Rating (DC): 33V; Power Dissipation: 1.5W; Power Rating: 1.5W; Length: 7.98mm; Height: 1.25mm; Width: 5.44mm; Terminal Pitch: 8mm; REACH SVHC: No SVHC; ComponentLink2URL: http://www.littelfuse.com/~/media/electronics/datasheets/resettable_ptcs/littelfuse_ptc_2920l_datasheet.pdf.pdf?src-supplier=Digi-Key; ComponentLink2Description: http://www.littelfuse.com/~/media/electronics/datasheets/resettable_ptcs/littelfuse_ptc_2920l_datasheet.pdf.pdf?src-supplier=Digi-Key; ComponentLink3URL: http://uk.rs-online.com/webdocs/1406/0900766b81406484.pdf?src-supplier=RSComponents; ComponentLink3Description: http://uk.rs-online.com/webdocs/1406/0900766b81406484.pdf?src-supplier=RSComponents; ComponentLink4URL: https://www.littelfuse.com/~/media/electronics/datasheets/resettable_ptcs/littelfuse_ptc_2920l_datasheet.pdf.pdf?src-supplier=Digi-Key; ComponentLink4Description: https://www.littelfuse.com/~/media/electronics/datasheets/resettable_ptcs/littelfuse_ptc_2920l_datasheet.pdf.pdf?src-supplier=Digi-Key; ComponentLink5URL: https://www.verical.com/server-webapp/html/getDatasheet?partID=57332&src-supplier=Verical; ComponentLink5Description: https://www.verical.com/server-webapp/html/getDatasheet?partID=57332&src-supplier=Verical; ComponentLink6URL: https://www.distrelec.biz/Web/Downloads/he/et/2920L_eng_datasheet.pdf?mime=application%2Fpdf&src-supplier=Distrelec; ComponentLink6Description: https://www.distrelec.biz/Web/Downloads/he/et/2920L_eng_datasheet.pdf?mime=application%2Fpdf&src-supplier=Distrelec; ComponentLink7URL: http://www.farnell.com/datasheets/1910222.pdf?src-supplier=Element14; ComponentLink7Description: http://www.farnell.com/datasheets/1910222.pdf?src-supplier=Element14; ComponentLink8URL: http://www.farnell.com/datasheets/578244.pdf?src-supplier=Element14; ComponentLink8Description: http://www.farnell.com/datasheets/578244.pdf?src-supplier=Element14; Supplier Part Number 2: F2871DKR-ND; Mount: Through Hole; Contact Plating: Tin; Number of Rows: 1; ComponentLink9URL: http://www1.futureelectronics.com/doc/SULLINS/SWR201-NRTN-SA-WH.pdf?src-supplier=Future+Electronics; ComponentLink9Description: http://www1.futureelectronics.com/doc/SULLINS/SWR201-NRTN-SA-WH.pdf?src-supplier=Future+Electronics; ComponentLink10URL: https://s3.amazonaws.com/catalogspreads-pdf/PAGE128%202mm%20SWR201%20SINGLE%20ROW%20WAFER%20ST%20RA.pdf?src-supplier=Digi-Key; ComponentLink10Description: https://s3.amazonaws.com/catalogspreads-pdf/PAGE128%202mm%20SWR201%20SINGLE%20ROW%20WAFER%20ST%20RA.pdf?src-supplier=Digi-Key